# Altium footprint library ref-packages-longpad.PCBLIB: 1527 footprints (part 71 of 103)
Each footprint in its own frame and in the unit in brackets; x right, y up, seen from the top. Pads: shape width x height; smd on the part's side, far side on the other; paste and mask are expansions set on the pad; w line width, h text height; cw(c..) or ccw(c..) is an arc to the next point about the centre after c.
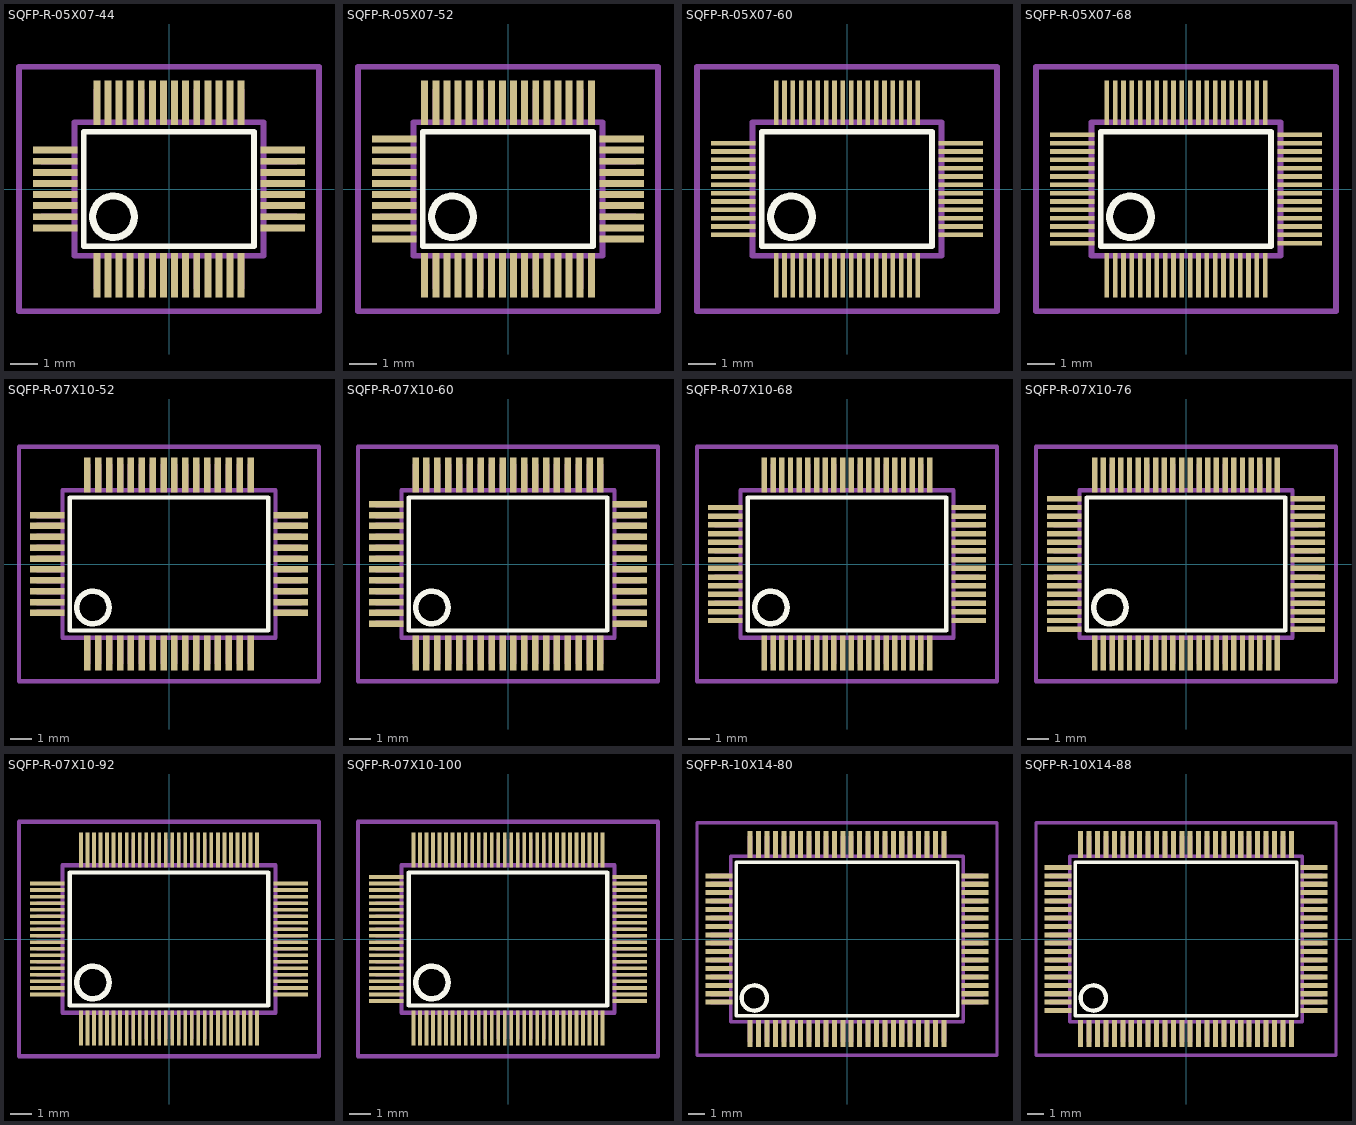
[diagram p70: the footprints below, top view; thin cyan lines are the x and y axes]

## SQFP-R-05X07-44 [mm]
pads (44):
  rect 0.25x1.6 smd: 1(-2.6,-3.1) 2(-2.2,-3.1) 3(-1.8,-3.1) 4(-1.4,-3.1) 5(-1,-3.1) 6(-0.6,-3.1) 7(-0.2,-3.1) 8(0.2,-3.1) 9(0.6,-3.1) 10(1,-3.1) 11(1.4,-3.1) 12(1.8,-3.1) 13(2.2,-3.1) 14(2.6,-3.1) 23(2.6,3.1) 24(2.2,3.1) 25(1.8,3.1) 26(1.4,3.1) 27(1,3.1) 28(0.6,3.1) 29(0.2,3.1) 30(-0.2,3.1) 31(-0.6,3.1) 32(-1,3.1) 33(-1.4,3.1) 34(-1.8,3.1) 35(-2.2,3.1) 36(-2.6,3.1)
  rect 1.6x0.25 smd: 15(4.1,-1.4) 16(4.1,-1) 17(4.1,-0.6) 18(4.1,-0.2) 19(4.1,0.2) 20(4.1,0.6) 21(4.1,1) 22(4.1,1.4) 37(-4.1,1.4) 38(-4.1,1) 39(-4.1,0.6) 40(-4.1,0.2) 41(-4.1,-0.2) 42(-4.1,-0.6) 43(-4.1,-1) 44(-4.1,-1.4)
Top Overlay:
  circle w0.254: c-2,-1 r0.75
  lines w0.203: -3.07,-2.06 3.06,-2.06 3.06,2.06 -3.07,2.06 -3.07,-2.06
Mechanical 16:
  rectangle: -2.71,-3.6 -2.49,-2.45
  rectangle: 3.45,-1.51 4.6,-1.29
  rectangle: -2.31,-3.6 -2.09,-2.45
  rectangle: -1.91,-3.6 -1.69,-2.45
  rectangle: -1.51,-3.6 -1.29,-2.45
  rectangle: -1.11,-3.6 -0.89,-2.45
  rectangle: -0.71,-3.6 -0.49,-2.45
  rectangle: -0.31,-3.6 -0.09,-2.45
  rectangle: 0.09,-3.6 0.31,-2.45
  rectangle: 0.49,-3.6 0.71,-2.45
  rectangle: 0.89,-3.6 1.11,-2.45
  rectangle: 1.29,-3.6 1.51,-2.45
  rectangle: 1.69,-3.6 1.91,-2.45
  rectangle: 2.09,-3.6 2.31,-2.45
  rectangle: 2.49,-3.6 2.71,-2.45
  rectangle: 3.45,-1.11 4.6,-0.89
  rectangle: 3.45,-0.71 4.6,-0.49
  rectangle: 3.45,-0.31 4.6,-0.09
  rectangle: 3.45,0.09 4.6,0.31
  rectangle: 3.45,0.49 4.6,0.71
  rectangle: 3.45,0.89 4.6,1.11
  rectangle: 3.45,1.29 4.6,1.51
  rectangle: 2.49,2.45 2.71,3.6
  rectangle: 2.09,2.45 2.31,3.6
  rectangle: 1.69,2.45 1.91,3.6
  rectangle: 1.29,2.45 1.51,3.6
  rectangle: 0.89,2.45 1.11,3.6
  rectangle: 0.49,2.45 0.71,3.6
  rectangle: 0.09,2.45 0.31,3.6
  rectangle: -0.31,2.45 -0.09,3.6
  rectangle: -0.71,2.45 -0.49,3.6
  rectangle: -1.11,2.45 -0.89,3.6
  rectangle: -1.51,2.45 -1.29,3.6
  rectangle: -1.91,2.45 -1.69,3.6
  rectangle: -2.31,2.45 -2.09,3.6
  rectangle: -2.71,2.45 -2.49,3.6
  rectangle: -4.6,1.29 -3.45,1.51
  rectangle: -4.6,0.89 -3.45,1.11
  rectangle: -4.6,0.49 -3.45,0.71
  rectangle: -4.6,0.09 -3.45,0.31
  rectangle: -4.6,-0.31 -3.45,-0.09
  rectangle: -4.6,-0.71 -3.45,-0.49
  rectangle: -4.6,-1.11 -3.45,-0.89
  rectangle: -4.6,-1.51 -3.45,-1.29
  lines w0.203: -3.4,-2.4 3.4,-2.4 3.4,2.4 -3.4,2.4 -3.4,-2.4
Mechanical 27:
  lines w0.2: -5.4,-4.4 -5.4,4.4 5.4,4.4 5.4,-4.4 -5.4,-4.4

## SQFP-R-05X07-52 [mm]
pads (52):
  rect 0.25x1.6 smd: 1(-3,-3.1) 2(-2.6,-3.1) 3(-2.2,-3.1) 4(-1.8,-3.1) 5(-1.4,-3.1) 6(-1,-3.1) 7(-0.6,-3.1) 8(-0.2,-3.1) 9(0.2,-3.1) 10(0.6,-3.1) 11(1,-3.1) 12(1.4,-3.1) 13(1.8,-3.1) 14(2.2,-3.1) 15(2.6,-3.1) 16(3,-3.1) 27(3,3.1) 28(2.6,3.1) 29(2.2,3.1) 30(1.8,3.1) 31(1.4,3.1) 32(1,3.1) 33(0.6,3.1) 34(0.2,3.1) 35(-0.2,3.1) 36(-0.6,3.1) 37(-1,3.1) 38(-1.4,3.1) 39(-1.8,3.1) 40(-2.2,3.1) 41(-2.6,3.1) 42(-3,3.1)
  rect 1.6x0.25 smd: 17(4.1,-1.8) 18(4.1,-1.4) 19(4.1,-1) 20(4.1,-0.6) 21(4.1,-0.2) 22(4.1,0.2) 23(4.1,0.6) 24(4.1,1) 25(4.1,1.4) 26(4.1,1.8) 43(-4.1,1.8) 44(-4.1,1.4) 45(-4.1,1) 46(-4.1,0.6) 47(-4.1,0.2) 48(-4.1,-0.2) 49(-4.1,-0.6) 50(-4.1,-1) 51(-4.1,-1.4) 52(-4.1,-1.8)
Top Overlay:
  circle w0.254: c-2,-1 r0.75
  lines w0.203: -3.07,-2.06 3.06,-2.06 3.06,2.06 -3.07,2.06 -3.07,-2.06
Mechanical 16:
  rectangle: -3.11,-3.6 -2.89,-2.45
  rectangle: 3.45,-1.91 4.6,-1.69
  rectangle: -2.71,-3.6 -2.49,-2.45
  rectangle: -2.31,-3.6 -2.09,-2.45
  rectangle: -1.91,-3.6 -1.69,-2.45
  rectangle: -1.51,-3.6 -1.29,-2.45
  rectangle: -1.11,-3.6 -0.89,-2.45
  rectangle: -0.71,-3.6 -0.49,-2.45
  rectangle: -0.31,-3.6 -0.09,-2.45
  rectangle: 0.09,-3.6 0.31,-2.45
  rectangle: 0.49,-3.6 0.71,-2.45
  rectangle: 0.89,-3.6 1.11,-2.45
  rectangle: 1.29,-3.6 1.51,-2.45
  rectangle: 1.69,-3.6 1.91,-2.45
  rectangle: 2.09,-3.6 2.31,-2.45
  rectangle: 2.49,-3.6 2.71,-2.45
  rectangle: 2.89,-3.6 3.11,-2.45
  rectangle: 3.45,-1.51 4.6,-1.29
  rectangle: 3.45,-1.11 4.6,-0.89
  rectangle: 3.45,-0.71 4.6,-0.49
  rectangle: 3.45,-0.31 4.6,-0.09
  rectangle: 3.45,0.09 4.6,0.31
  rectangle: 3.45,0.49 4.6,0.71
  rectangle: 3.45,0.89 4.6,1.11
  rectangle: 3.45,1.29 4.6,1.51
  rectangle: 3.45,1.69 4.6,1.91
  rectangle: 2.89,2.45 3.11,3.6
  rectangle: 2.49,2.45 2.71,3.6
  rectangle: 2.09,2.45 2.31,3.6
  rectangle: 1.69,2.45 1.91,3.6
  rectangle: 1.29,2.45 1.51,3.6
  rectangle: 0.89,2.45 1.11,3.6
  rectangle: 0.49,2.45 0.71,3.6
  rectangle: 0.09,2.45 0.31,3.6
  rectangle: -0.31,2.45 -0.09,3.6
  rectangle: -0.71,2.45 -0.49,3.6
  rectangle: -1.11,2.45 -0.89,3.6
  rectangle: -1.51,2.45 -1.29,3.6
  rectangle: -1.91,2.45 -1.69,3.6
  rectangle: -2.31,2.45 -2.09,3.6
  rectangle: -2.71,2.45 -2.49,3.6
  rectangle: -3.11,2.45 -2.89,3.6
  rectangle: -4.6,1.69 -3.45,1.91
  rectangle: -4.6,1.29 -3.45,1.51
  rectangle: -4.6,0.89 -3.45,1.11
  rectangle: -4.6,0.49 -3.45,0.71
  rectangle: -4.6,0.09 -3.45,0.31
  rectangle: -4.6,-0.31 -3.45,-0.09
  rectangle: -4.6,-0.71 -3.45,-0.49
  rectangle: -4.6,-1.11 -3.45,-0.89
  rectangle: -4.6,-1.51 -3.45,-1.29
  rectangle: -4.6,-1.91 -3.45,-1.69
  lines w0.203: -3.4,-2.4 3.4,-2.4 3.4,2.4 -3.4,2.4 -3.4,-2.4
Mechanical 27:
  lines w0.2: -5.4,-4.4 -5.4,4.4 5.4,4.4 5.4,-4.4 -5.4,-4.4

## SQFP-R-05X07-60 [mm]
pads (60):
  rect 0.17x1.6 smd: 1(-2.55,-3.1) 2(-2.25,-3.1) 3(-1.95,-3.1) 4(-1.65,-3.1) 5(-1.35,-3.1) 6(-1.05,-3.1) 7(-0.75,-3.1) 8(-0.45,-3.1) 9(-0.15,-3.1) 10(0.15,-3.1) 11(0.45,-3.1) 12(0.75,-3.1) 13(1.05,-3.1) 14(1.35,-3.1) 15(1.65,-3.1) 16(1.95,-3.1) 17(2.25,-3.1) 18(2.55,-3.1) 31(2.55,3.1) 32(2.25,3.1) 33(1.95,3.1) 34(1.65,3.1) 35(1.35,3.1) 36(1.05,3.1) 37(0.75,3.1) 38(0.45,3.1) 39(0.15,3.1) 40(-0.15,3.1) 41(-0.45,3.1) 42(-0.75,3.1) 43(-1.05,3.1) 44(-1.35,3.1) 45(-1.65,3.1) 46(-1.95,3.1) 47(-2.25,3.1) 48(-2.55,3.1)
  rect 1.6x0.17 smd: 19(4.1,-1.65) 20(4.1,-1.35) 21(4.1,-1.05) 22(4.1,-0.75) 23(4.1,-0.45) 24(4.1,-0.15) 25(4.1,0.15) 26(4.1,0.45) 27(4.1,0.75) 28(4.1,1.05) 29(4.1,1.35) 30(4.1,1.65) 49(-4.1,1.65) 50(-4.1,1.35) 51(-4.1,1.05) 52(-4.1,0.75) 53(-4.1,0.45) 54(-4.1,0.15) 55(-4.1,-0.15) 56(-4.1,-0.45) 57(-4.1,-0.75) 58(-4.1,-1.05) 59(-4.1,-1.35) 60(-4.1,-1.65)
Top Overlay:
  circle w0.254: c-2,-1 r0.75
  lines w0.203: -3.07,-2.06 3.06,-2.06 3.06,2.06 -3.07,2.06 -3.07,-2.06
Mechanical 16:
  rectangle: -2.62,-3.6 -2.48,-2.45
  rectangle: 3.45,-1.72 4.6,-1.58
  rectangle: -2.32,-3.6 -2.18,-2.45
  rectangle: -2.02,-3.6 -1.88,-2.45
  rectangle: -1.72,-3.6 -1.58,-2.45
  rectangle: -1.42,-3.6 -1.28,-2.45
  rectangle: -1.12,-3.6 -0.98,-2.45
  rectangle: -0.82,-3.6 -0.68,-2.45
  rectangle: -0.52,-3.6 -0.38,-2.45
  rectangle: -0.22,-3.6 -0.08,-2.45
  rectangle: 0.08,-3.6 0.22,-2.45
  rectangle: 0.38,-3.6 0.52,-2.45
  rectangle: 0.68,-3.6 0.82,-2.45
  rectangle: 0.98,-3.6 1.12,-2.45
  rectangle: 1.28,-3.6 1.42,-2.45
  rectangle: 1.58,-3.6 1.72,-2.45
  rectangle: 1.88,-3.6 2.02,-2.45
  rectangle: 2.18,-3.6 2.32,-2.45
  rectangle: 2.48,-3.6 2.62,-2.45
  rectangle: 3.45,-1.42 4.6,-1.28
  rectangle: 3.45,-1.12 4.6,-0.98
  rectangle: 3.45,-0.82 4.6,-0.68
  rectangle: 3.45,-0.52 4.6,-0.38
  rectangle: 3.45,-0.22 4.6,-0.08
  rectangle: 3.45,0.08 4.6,0.22
  rectangle: 3.45,0.38 4.6,0.52
  rectangle: 3.45,0.68 4.6,0.82
  rectangle: 3.45,0.98 4.6,1.12
  rectangle: 3.45,1.28 4.6,1.42
  rectangle: 3.45,1.58 4.6,1.72
  rectangle: 2.48,2.45 2.62,3.6
  rectangle: 2.18,2.45 2.32,3.6
  rectangle: 1.88,2.45 2.02,3.6
  rectangle: 1.58,2.45 1.72,3.6
  rectangle: 1.28,2.45 1.42,3.6
  rectangle: 0.98,2.45 1.12,3.6
  rectangle: 0.68,2.45 0.82,3.6
  rectangle: 0.38,2.45 0.52,3.6
  rectangle: 0.08,2.45 0.22,3.6
  rectangle: -0.22,2.45 -0.08,3.6
  rectangle: -0.52,2.45 -0.38,3.6
  rectangle: -0.82,2.45 -0.68,3.6
  rectangle: -1.12,2.45 -0.98,3.6
  rectangle: -1.42,2.45 -1.28,3.6
  rectangle: -1.72,2.45 -1.58,3.6
  rectangle: -2.02,2.45 -1.88,3.6
  rectangle: -2.32,2.45 -2.18,3.6
  rectangle: -2.62,2.45 -2.48,3.6
  rectangle: -4.6,1.58 -3.45,1.72
  rectangle: -4.6,1.28 -3.45,1.42
  rectangle: -4.6,0.98 -3.45,1.12
  rectangle: -4.6,0.68 -3.45,0.82
  rectangle: -4.6,0.38 -3.45,0.52
  rectangle: -4.6,0.08 -3.45,0.22
  rectangle: -4.6,-0.22 -3.45,-0.08
  rectangle: -4.6,-0.52 -3.45,-0.38
  rectangle: -4.6,-0.82 -3.45,-0.68
  rectangle: -4.6,-1.12 -3.45,-0.98
  rectangle: -4.6,-1.42 -3.45,-1.28
  rectangle: -4.6,-1.72 -3.45,-1.58
  lines w0.203: -3.4,-2.4 3.4,-2.4 3.4,2.4 -3.4,2.4 -3.4,-2.4
Mechanical 27:
  lines w0.2: -5.4,-4.4 -5.4,4.4 5.4,4.4 5.4,-4.4 -5.4,-4.4

## SQFP-R-05X07-68 [mm]
pads (68):
  rect 0.17x1.6 smd: 1(-2.85,-3.1) 2(-2.55,-3.1) 3(-2.25,-3.1) 4(-1.95,-3.1) 5(-1.65,-3.1) 6(-1.35,-3.1) 7(-1.05,-3.1) 8(-0.75,-3.1) 9(-0.45,-3.1) 10(-0.15,-3.1) 11(0.15,-3.1) 12(0.45,-3.1) 13(0.75,-3.1) 14(1.05,-3.1) 15(1.35,-3.1) 16(1.65,-3.1) 17(1.95,-3.1) 18(2.25,-3.1) 19(2.55,-3.1) 20(2.85,-3.1) 35(2.85,3.1) 36(2.55,3.1) 37(2.25,3.1) 38(1.95,3.1) 39(1.65,3.1) 40(1.35,3.1) 41(1.05,3.1) 42(0.75,3.1) 43(0.45,3.1) 44(0.15,3.1) 45(-0.15,3.1) 46(-0.45,3.1) 47(-0.75,3.1) 48(-1.05,3.1) 49(-1.35,3.1) 50(-1.65,3.1) 51(-1.95,3.1) 52(-2.25,3.1) 53(-2.55,3.1) 54(-2.85,3.1)
  rect 1.6x0.17 smd: 21(4.1,-1.95) 22(4.1,-1.65) 23(4.1,-1.35) 24(4.1,-1.05) 25(4.1,-0.75) 26(4.1,-0.45) 27(4.1,-0.15) 28(4.1,0.15) 29(4.1,0.45) 30(4.1,0.75) 31(4.1,1.05) 32(4.1,1.35) 33(4.1,1.65) 34(4.1,1.95) 55(-4.1,1.95) 56(-4.1,1.65) 57(-4.1,1.35) 58(-4.1,1.05) 59(-4.1,0.75) 60(-4.1,0.45) 61(-4.1,0.15) 62(-4.1,-0.15) 63(-4.1,-0.45) 64(-4.1,-0.75) 65(-4.1,-1.05) 66(-4.1,-1.35) 67(-4.1,-1.65) 68(-4.1,-1.95)
Top Overlay:
  circle w0.254: c-2,-1 r0.75
  lines w0.203: -3.07,-2.06 3.06,-2.06 3.06,2.06 -3.07,2.06 -3.07,-2.06
Mechanical 16:
  rectangle: -2.92,-3.6 -2.78,-2.45
  rectangle: 3.45,-2.02 4.6,-1.88
  rectangle: -2.62,-3.6 -2.48,-2.45
  rectangle: -2.32,-3.6 -2.18,-2.45
  rectangle: -2.02,-3.6 -1.88,-2.45
  rectangle: -1.72,-3.6 -1.58,-2.45
  rectangle: -1.42,-3.6 -1.28,-2.45
  rectangle: -1.12,-3.6 -0.98,-2.45
  rectangle: -0.82,-3.6 -0.68,-2.45
  rectangle: -0.52,-3.6 -0.38,-2.45
  rectangle: -0.22,-3.6 -0.08,-2.45
  rectangle: 0.08,-3.6 0.22,-2.45
  rectangle: 0.38,-3.6 0.52,-2.45
  rectangle: 0.68,-3.6 0.82,-2.45
  rectangle: 0.98,-3.6 1.12,-2.45
  rectangle: 1.28,-3.6 1.42,-2.45
  rectangle: 1.58,-3.6 1.72,-2.45
  rectangle: 1.88,-3.6 2.02,-2.45
  rectangle: 2.18,-3.6 2.32,-2.45
  rectangle: 2.48,-3.6 2.62,-2.45
  rectangle: 2.78,-3.6 2.92,-2.45
  rectangle: 3.45,-1.72 4.6,-1.58
  rectangle: 3.45,-1.42 4.6,-1.28
  rectangle: 3.45,-1.12 4.6,-0.98
  rectangle: 3.45,-0.82 4.6,-0.68
  rectangle: 3.45,-0.52 4.6,-0.38
  rectangle: 3.45,-0.22 4.6,-0.08
  rectangle: 3.45,0.08 4.6,0.22
  rectangle: 3.45,0.38 4.6,0.52
  rectangle: 3.45,0.68 4.6,0.82
  rectangle: 3.45,0.98 4.6,1.12
  rectangle: 3.45,1.28 4.6,1.42
  rectangle: 3.45,1.58 4.6,1.72
  rectangle: 3.45,1.88 4.6,2.02
  rectangle: 2.78,2.45 2.92,3.6
  rectangle: 2.48,2.45 2.62,3.6
  rectangle: 2.18,2.45 2.32,3.6
  rectangle: 1.88,2.45 2.02,3.6
  rectangle: 1.58,2.45 1.72,3.6
  rectangle: 1.28,2.45 1.42,3.6
  rectangle: 0.98,2.45 1.12,3.6
  rectangle: 0.68,2.45 0.82,3.6
  rectangle: 0.38,2.45 0.52,3.6
  rectangle: 0.08,2.45 0.22,3.6
  rectangle: -0.22,2.45 -0.08,3.6
  rectangle: -0.52,2.45 -0.38,3.6
  rectangle: -0.82,2.45 -0.68,3.6
  rectangle: -1.12,2.45 -0.98,3.6
  rectangle: -1.42,2.45 -1.28,3.6
  rectangle: -1.72,2.45 -1.58,3.6
  rectangle: -2.02,2.45 -1.88,3.6
  rectangle: -2.32,2.45 -2.18,3.6
  rectangle: -2.62,2.45 -2.48,3.6
  rectangle: -2.92,2.45 -2.78,3.6
  rectangle: -4.6,1.88 -3.45,2.02
  rectangle: -4.6,1.58 -3.45,1.72
  rectangle: -4.6,1.28 -3.45,1.42
  rectangle: -4.6,0.98 -3.45,1.12
  rectangle: -4.6,0.68 -3.45,0.82
  rectangle: -4.6,0.38 -3.45,0.52
  rectangle: -4.6,0.08 -3.45,0.22
  rectangle: -4.6,-0.22 -3.45,-0.08
  rectangle: -4.6,-0.52 -3.45,-0.38
  rectangle: -4.6,-0.82 -3.45,-0.68
  rectangle: -4.6,-1.12 -3.45,-0.98
  rectangle: -4.6,-1.42 -3.45,-1.28
  rectangle: -4.6,-1.72 -3.45,-1.58
  rectangle: -4.6,-2.02 -3.45,-1.88
  lines w0.203: -3.4,-2.4 3.4,-2.4 3.4,2.4 -3.4,2.4 -3.4,-2.4
Mechanical 27:
  lines w0.2: -5.4,-4.4 -5.4,4.4 5.4,4.4 5.4,-4.4 -5.4,-4.4

## SQFP-R-07X10-52 [mil]
pads (52):
  rect 11.81x62.99 smd: 1(-147.64,-161.42) 2(-127.95,-161.42) 3(-108.27,-161.42) 4(-88.58,-161.42) 5(-68.9,-161.42) 6(-49.21,-161.42) 7(-29.53,-161.42) 8(-9.84,-161.42) 9(9.84,-161.42) 10(29.53,-161.42) 11(49.21,-161.42) 12(68.9,-161.42) 13(88.58,-161.42) 14(108.27,-161.42) 15(127.95,-161.42) 16(147.64,-161.42) 27(147.64,161.42) 28(127.95,161.42) 29(108.27,161.42) 30(88.58,161.42) 31(68.9,161.42) 32(49.21,161.42) 33(29.53,161.42) 34(9.84,161.42) 35(-9.84,161.42) 36(-29.53,161.42) 37(-49.21,161.42) 38(-68.9,161.42) 39(-88.58,161.42) 40(-108.27,161.42) 41(-127.95,161.42) 42(-147.64,161.42)
  rect 62.99x11.81 smd: 17(220.47,-88.58) 18(220.47,-68.9) 19(220.47,-49.21) 20(220.47,-29.53) 21(220.47,-9.84) 22(220.47,9.84) 23(220.47,29.53) 24(220.47,49.21) 25(220.47,68.9) 26(220.47,88.58) 43(-220.47,88.58) 44(-220.47,68.9) 45(-220.47,49.21) 46(-220.47,29.53) 47(-220.47,9.84) 48(-220.47,-9.84) 49(-220.47,-29.53) 50(-220.47,-49.21) 51(-220.47,-68.9) 52(-220.47,-88.58)
Top Overlay:
  circle w10: c-137.8,-78.74 r29.53
  lines w8: -179.92,-120.47 179.53,-120.47 179.53,120.47 -179.92,120.47 -179.92,-120.47
Mechanical 16:
  rectangle: -153.54,-181.1 -141.73,-135.83
  rectangle: 194.88,-94.49 240.16,-82.68
  rectangle: -133.86,-181.1 -122.05,-135.83
  rectangle: -114.17,-181.1 -102.36,-135.83
  rectangle: -94.49,-181.1 -82.68,-135.83
  rectangle: -74.8,-181.1 -62.99,-135.83
  rectangle: -55.12,-181.1 -43.31,-135.83
  rectangle: -35.43,-181.1 -23.62,-135.83
  rectangle: -15.75,-181.1 -3.94,-135.83
  rectangle: 3.94,-181.1 15.75,-135.83
  rectangle: 23.62,-181.1 35.43,-135.83
  rectangle: 43.31,-181.1 55.12,-135.83
  rectangle: 62.99,-181.1 74.8,-135.83
  rectangle: 82.68,-181.1 94.49,-135.83
  rectangle: 102.36,-181.1 114.17,-135.83
  rectangle: 122.05,-181.1 133.86,-135.83
  rectangle: 141.73,-181.1 153.54,-135.83
  rectangle: 194.88,-74.8 240.16,-62.99
  rectangle: 194.88,-55.12 240.16,-43.31
  rectangle: 194.88,-35.43 240.16,-23.62
  rectangle: 194.88,-15.75 240.16,-3.94
  rectangle: 194.88,3.94 240.16,15.75
  rectangle: 194.88,23.62 240.16,35.43
  rectangle: 194.88,43.31 240.16,55.12
  rectangle: 194.88,62.99 240.16,74.8
  rectangle: 194.88,82.68 240.16,94.49
  rectangle: 141.73,135.83 153.54,181.1
  rectangle: 122.05,135.83 133.86,181.1
  rectangle: 102.36,135.83 114.17,181.1
  rectangle: 82.68,135.83 94.49,181.1
  rectangle: 62.99,135.83 74.8,181.1
  rectangle: 43.31,135.83 55.12,181.1
  rectangle: 23.62,135.83 35.43,181.1
  rectangle: 3.94,135.83 15.75,181.1
  rectangle: -15.75,135.83 -3.94,181.1
  rectangle: -35.43,135.83 -23.62,181.1
  rectangle: -55.12,135.83 -43.31,181.1
  rectangle: -74.8,135.83 -62.99,181.1
  rectangle: -94.49,135.83 -82.68,181.1
  rectangle: -114.17,135.83 -102.36,181.1
  rectangle: -133.86,135.83 -122.05,181.1
  rectangle: -153.54,135.83 -141.73,181.1
  rectangle: -240.16,82.68 -194.88,94.49
  rectangle: -240.16,62.99 -194.88,74.8
  rectangle: -240.16,43.31 -194.88,55.12
  rectangle: -240.16,23.62 -194.88,35.43
  rectangle: -240.16,3.94 -194.88,15.75
  rectangle: -240.16,-15.75 -194.88,-3.94
  rectangle: -240.16,-35.43 -194.88,-23.62
  rectangle: -240.16,-55.12 -194.88,-43.31
  rectangle: -240.16,-74.8 -194.88,-62.99
  rectangle: -240.16,-94.49 -194.88,-82.68
  lines w8: -192.91,-133.86 192.91,-133.86 192.91,133.86 -192.91,133.86 -192.91,-133.86
Mechanical 27:
  lines w7.87: -271.65,-212.6 -271.65,212.6 271.65,212.6 271.65,-212.6 -271.65,-212.6

## SQFP-R-07X10-60 [mil]
pads (60):
  rect 11.81x62.99 smd: 1(-167.32,-161.42) 2(-147.64,-161.42) 3(-127.95,-161.42) 4(-108.27,-161.42) 5(-88.58,-161.42) 6(-68.9,-161.42) 7(-49.21,-161.42) 8(-29.53,-161.42) 9(-9.84,-161.42) 10(9.84,-161.42) 11(29.53,-161.42) 12(49.21,-161.42) 13(68.9,-161.42) 14(88.58,-161.42) 15(108.27,-161.42) 16(127.95,-161.42) 17(147.64,-161.42) 18(167.32,-161.42) 31(167.32,161.42) 32(147.64,161.42) 33(127.95,161.42) 34(108.27,161.42) 35(88.58,161.42) 36(68.9,161.42) 37(49.21,161.42) 38(29.53,161.42) 39(9.84,161.42) 40(-9.84,161.42) 41(-29.53,161.42) 42(-49.21,161.42) 43(-68.9,161.42) 44(-88.58,161.42) 45(-108.27,161.42) 46(-127.95,161.42) 47(-147.64,161.42) 48(-167.32,161.42)
  rect 62.99x11.81 smd: 19(220.47,-108.27) 20(220.47,-88.58) 21(220.47,-68.9) 22(220.47,-49.21) 23(220.47,-29.53) 24(220.47,-9.84) 25(220.47,9.84) 26(220.47,29.53) 27(220.47,49.21) 28(220.47,68.9) 29(220.47,88.58) 30(220.47,108.27) 49(-220.47,108.27) 50(-220.47,88.58) 51(-220.47,68.9) 52(-220.47,49.21) 53(-220.47,29.53) 54(-220.47,9.84) 55(-220.47,-9.84) 56(-220.47,-29.53) 57(-220.47,-49.21) 58(-220.47,-68.9) 59(-220.47,-88.58) 60(-220.47,-108.27)
Top Overlay:
  circle w10: c-137.8,-78.74 r29.53
  lines w8: -179.92,-120.47 179.53,-120.47 179.53,120.47 -179.92,120.47 -179.92,-120.47
Mechanical 16:
  rectangle: -173.23,-181.1 -161.42,-135.83
  rectangle: 194.88,-114.17 240.16,-102.36
  rectangle: -153.54,-181.1 -141.73,-135.83
  rectangle: -133.86,-181.1 -122.05,-135.83
  rectangle: -114.17,-181.1 -102.36,-135.83
  rectangle: -94.49,-181.1 -82.68,-135.83
  rectangle: -74.8,-181.1 -62.99,-135.83
  rectangle: -55.12,-181.1 -43.31,-135.83
  rectangle: -35.43,-181.1 -23.62,-135.83
  rectangle: -15.75,-181.1 -3.94,-135.83
  rectangle: 3.94,-181.1 15.75,-135.83
  rectangle: 23.62,-181.1 35.43,-135.83
  rectangle: 43.31,-181.1 55.12,-135.83
  rectangle: 62.99,-181.1 74.8,-135.83
  rectangle: 82.68,-181.1 94.49,-135.83
  rectangle: 102.36,-181.1 114.17,-135.83
  rectangle: 122.05,-181.1 133.86,-135.83
  rectangle: 141.73,-181.1 153.54,-135.83
  rectangle: 161.42,-181.1 173.23,-135.83
  rectangle: 194.88,-94.49 240.16,-82.68
  rectangle: 194.88,-74.8 240.16,-62.99
  rectangle: 194.88,-55.12 240.16,-43.31
  rectangle: 194.88,-35.43 240.16,-23.62
  rectangle: 194.88,-15.75 240.16,-3.94
  rectangle: 194.88,3.94 240.16,15.75
  rectangle: 194.88,23.62 240.16,35.43
  rectangle: 194.88,43.31 240.16,55.12
  rectangle: 194.88,62.99 240.16,74.8
  rectangle: 194.88,82.68 240.16,94.49
  rectangle: 194.88,102.36 240.16,114.17
  rectangle: 161.42,135.83 173.23,181.1
  rectangle: 141.73,135.83 153.54,181.1
  rectangle: 122.05,135.83 133.86,181.1
  rectangle: 102.36,135.83 114.17,181.1
  rectangle: 82.68,135.83 94.49,181.1
  rectangle: 62.99,135.83 74.8,181.1
  rectangle: 43.31,135.83 55.12,181.1
  rectangle: 23.62,135.83 35.43,181.1
  rectangle: 3.94,135.83 15.75,181.1
  rectangle: -15.75,135.83 -3.94,181.1
  rectangle: -35.43,135.83 -23.62,181.1
  rectangle: -55.12,135.83 -43.31,181.1
  rectangle: -74.8,135.83 -62.99,181.1
  rectangle: -94.49,135.83 -82.68,181.1
  rectangle: -114.17,135.83 -102.36,181.1
  rectangle: -133.86,135.83 -122.05,181.1
  rectangle: -153.54,135.83 -141.73,181.1
  rectangle: -173.23,135.83 -161.42,181.1
  rectangle: -240.16,102.36 -194.88,114.17
  rectangle: -240.16,82.68 -194.88,94.49
  rectangle: -240.16,62.99 -194.88,74.8
  rectangle: -240.16,43.31 -194.88,55.12
  rectangle: -240.16,23.62 -194.88,35.43
  rectangle: -240.16,3.94 -194.88,15.75
  rectangle: -240.16,-15.75 -194.88,-3.94
  rectangle: -240.16,-35.43 -194.88,-23.62
  rectangle: -240.16,-55.12 -194.88,-43.31
  rectangle: -240.16,-74.8 -194.88,-62.99
  rectangle: -240.16,-94.49 -194.88,-82.68
  rectangle: -240.16,-114.17 -194.88,-102.36
  lines w8: -192.91,-133.86 192.91,-133.86 192.91,133.86 -192.91,133.86 -192.91,-133.86
Mechanical 27:
  lines w7.87: -271.65,-212.6 -271.65,212.6 271.65,212.6 271.65,-212.6 -271.65,-212.6

## SQFP-R-07X10-68 [mm]
pads (68):
  rect 0.25x1.6 smd: 1(-3.8,-4.1) 2(-3.4,-4.1) 3(-3,-4.1) 4(-2.6,-4.1) 5(-2.2,-4.1) 6(-1.8,-4.1) 7(-1.4,-4.1) 8(-1,-4.1) 9(-0.6,-4.1) 10(-0.2,-4.1) 11(0.2,-4.1) 12(0.6,-4.1) 13(1,-4.1) 14(1.4,-4.1) 15(1.8,-4.1) 16(2.2,-4.1) 17(2.6,-4.1) 18(3,-4.1) 19(3.4,-4.1) 20(3.8,-4.1) 35(3.8,4.1) 36(3.4,4.1) 37(3,4.1) 38(2.6,4.1) 39(2.2,4.1) 40(1.8,4.1) 41(1.4,4.1) 42(1,4.1) 43(0.6,4.1) 44(0.2,4.1) 45(-0.2,4.1) 46(-0.6,4.1) 47(-1,4.1) 48(-1.4,4.1) 49(-1.8,4.1) 50(-2.2,4.1) 51(-2.6,4.1) 52(-3,4.1) 53(-3.4,4.1) 54(-3.8,4.1)
  rect 1.6x0.25 smd: 21(5.6,-2.6) 22(5.6,-2.2) 23(5.6,-1.8) 24(5.6,-1.4) 25(5.6,-1) 26(5.6,-0.6) 27(5.6,-0.2) 28(5.6,0.2) 29(5.6,0.6) 30(5.6,1) 31(5.6,1.4) 32(5.6,1.8) 33(5.6,2.2) 34(5.6,2.6) 55(-5.6,2.6) 56(-5.6,2.2) 57(-5.6,1.8) 58(-5.6,1.4) 59(-5.6,1) 60(-5.6,0.6) 61(-5.6,0.2) 62(-5.6,-0.2) 63(-5.6,-0.6) 64(-5.6,-1) 65(-5.6,-1.4) 66(-5.6,-1.8) 67(-5.6,-2.2) 68(-5.6,-2.6)
Top Overlay:
  circle w0.254: c-3.5,-2 r0.75
  lines w0.203: -4.57,-3.06 4.56,-3.06 4.56,3.06 -4.57,3.06 -4.57,-3.06
Mechanical 16:
  rectangle: -3.91,-4.6 -3.69,-3.45
  rectangle: 4.95,-2.71 6.1,-2.49
  rectangle: -3.51,-4.6 -3.29,-3.45
  rectangle: -3.11,-4.6 -2.89,-3.45
  rectangle: -2.71,-4.6 -2.49,-3.45
  rectangle: -2.31,-4.6 -2.09,-3.45
  rectangle: -1.91,-4.6 -1.69,-3.45
  rectangle: -1.51,-4.6 -1.29,-3.45
  rectangle: -1.11,-4.6 -0.89,-3.45
  rectangle: -0.71,-4.6 -0.49,-3.45
  rectangle: -0.31,-4.6 -0.09,-3.45
  rectangle: 0.09,-4.6 0.31,-3.45
  rectangle: 0.49,-4.6 0.71,-3.45
  rectangle: 0.89,-4.6 1.11,-3.45
  rectangle: 1.29,-4.6 1.51,-3.45
  rectangle: 1.69,-4.6 1.91,-3.45
  rectangle: 2.09,-4.6 2.31,-3.45
  rectangle: 2.49,-4.6 2.71,-3.45
  rectangle: 2.89,-4.6 3.11,-3.45
  rectangle: 3.29,-4.6 3.51,-3.45
  rectangle: 3.69,-4.6 3.91,-3.45
  rectangle: 4.95,-2.31 6.1,-2.09
  rectangle: 4.95,-1.91 6.1,-1.69
  rectangle: 4.95,-1.51 6.1,-1.29
  rectangle: 4.95,-1.11 6.1,-0.89
  rectangle: 4.95,-0.71 6.1,-0.49
  rectangle: 4.95,-0.31 6.1,-0.09
  rectangle: 4.95,0.09 6.1,0.31
  rectangle: 4.95,0.49 6.1,0.71
  rectangle: 4.95,0.89 6.1,1.11
  rectangle: 4.95,1.29 6.1,1.51
  rectangle: 4.95,1.69 6.1,1.91
  rectangle: 4.95,2.09 6.1,2.31
  rectangle: 4.95,2.49 6.1,2.71
  rectangle: 3.69,3.45 3.91,4.6
  rectangle: 3.29,3.45 3.51,4.6
  rectangle: 2.89,3.45 3.11,4.6
  rectangle: 2.49,3.45 2.71,4.6
  rectangle: 2.09,3.45 2.31,4.6
  rectangle: 1.69,3.45 1.91,4.6
  rectangle: 1.29,3.45 1.51,4.6
  rectangle: 0.89,3.45 1.11,4.6
  rectangle: 0.49,3.45 0.71,4.6
  rectangle: 0.09,3.45 0.31,4.6
  rectangle: -0.31,3.45 -0.09,4.6
  rectangle: -0.71,3.45 -0.49,4.6
  rectangle: -1.11,3.45 -0.89,4.6
  rectangle: -1.51,3.45 -1.29,4.6
  rectangle: -1.91,3.45 -1.69,4.6
  rectangle: -2.31,3.45 -2.09,4.6